# Altium footprint library Transformers.PcbLib: 81 footprints (part 6 of 6)
Each footprint in its own frame and in the unit in brackets; x right, y up, seen from the top. Pads: shape width x height; smd on the part's side, far side on the other; paste and mask are expansions set on the pad; w line width, h text height; cw(c..) or ccw(c..) is an arc to the next point about the centre after c.
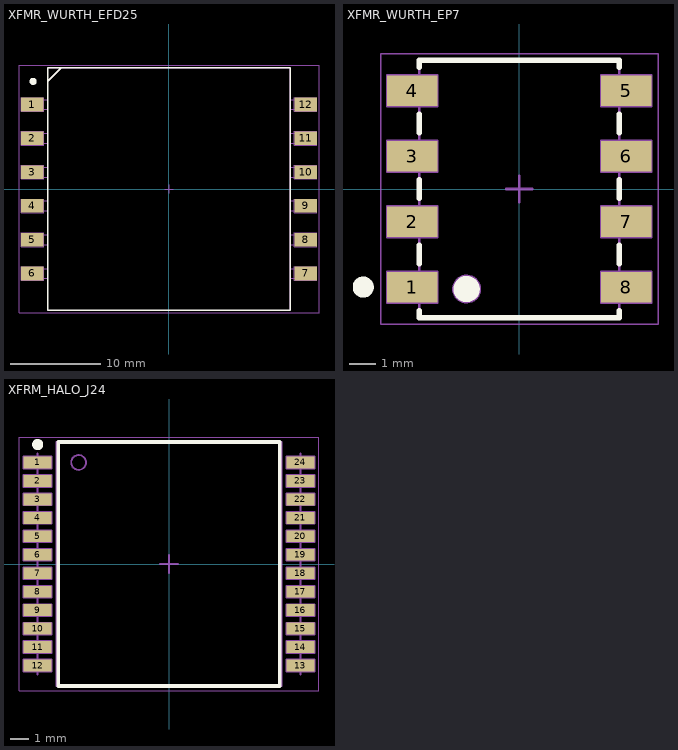
[diagram p5: the footprints below, top view; thin cyan lines are the x and y axes]

## XFMR_WURTH_EFD25 [mm] "WE-FB Flyback Transformer, Body 32.31 x 27.03mm, Size EFD25"
height 13.69
pads (12):
  rect 2.5x1.52 smd: 1(-15.19,9.4) 2(-15.19,5.64) 3(-15.19,1.88) 4(-15.19,-1.88) 5(-15.19,-5.64) 6(-15.19,-9.4) 7(15.19,-9.4) 8(15.19,-5.64) 9(15.19,-1.88) 10(15.19,1.88) 11(15.19,5.64) 12(15.19,9.4)
Top Overlay:
  circle w0.4: c-15.125,11.975 r0.2
  lines w0.2: -12,13.5 -13.5,12 ; -13.5,12 -13.5,12 ; -13.5,-13.5 13.5,-13.5 13.5,13.5 -13.5,13.5 -13.5,-13.5
Mechanical 8:
  lines w0.1: -15.69,-9.4 -15.19,-9.4 ; -15.69,-5.64 -15.19,-5.64 ; -15.69,-1.88 -15.19,-1.88 ; -15.69,1.88 -15.19,1.88 ; -15.69,5.64 -15.19,5.64 ; -15.69,9.4 -15.19,9.4 ; -15.19,-9.9 -15.19,-9.4 ; -15.19,-8.9 -15.19,-9.4 ; -15.19,-6.14 -15.19,-5.64 ; -15.19,-5.14 -15.19,-5.64 ; -15.19,-2.38 -15.19,-1.88 ; -15.19,-1.38 -15.19,-1.88 ; -15.19,1.38 -15.19,1.88 ; -15.19,2.38 -15.19,1.88 ; -15.19,5.14 -15.19,5.64 ; -15.19,6.14 -15.19,5.64 ; -15.19,8.9 -15.19,9.4 ; -15.19,9.9 -15.19,9.4 ; -14.69,-9.4 -15.19,-9.4 ; -14.69,-5.64 -15.19,-5.64 ; -14.69,-1.88 -15.19,-1.88 ; -14.69,1.88 -15.19,1.88 ; -14.69,5.64 -15.19,5.64 ; -14.69,9.4 -15.19,9.4 ; -0.5,0 0,0 ; 0,-0.5 0,0 ; 0,0.5 0,0 ; 0.5,0 0,0 ; 14.69,-9.4 15.19,-9.4 ; 14.69,-5.64 15.19,-5.64 ; 14.69,-1.88 15.19,-1.88 ; 14.69,1.88 15.19,1.88 ; 14.69,5.64 15.19,5.64 ; 14.69,9.4 15.19,9.4 ; 15.19,-9.9 15.19,-9.4 ; 15.19,-8.9 15.19,-9.4 ; 15.19,-6.14 15.19,-5.64 ; 15.19,-5.14 15.19,-5.64 ; 15.19,-2.38 15.19,-1.88 ; 15.19,-1.38 15.19,-1.88 ; 15.19,1.38 15.19,1.88 ; 15.19,2.38 15.19,1.88 ; 15.19,5.14 15.19,5.64 ; 15.19,6.14 15.19,5.64 ; 15.19,8.9 15.19,9.4 ; 15.19,9.9 15.19,9.4 ; 15.69,-9.4 15.19,-9.4 ; 15.69,-5.64 15.19,-5.64 ; 15.69,-1.88 15.19,-1.88 ; 15.69,1.88 15.19,1.88 ; 15.69,5.64 15.19,5.64 ; 15.69,9.4 15.19,9.4 ; -16.44,-10.16 -16.44,-8.64 -13.94,-8.64 -13.94,-10.16 -16.44,-10.16 ; -16.44,-6.4 -16.44,-4.88 -13.94,-4.88 -13.94,-6.4 -16.44,-6.4 ; -16.44,-2.64 -16.44,-1.12 -13.94,-1.12 -13.94,-2.64 -16.44,-2.64 ; -16.44,1.12 -16.44,2.64 -13.94,2.64 -13.94,1.12 -16.44,1.12 ; -16.44,4.88 -16.44,6.4 -13.94,6.4 -13.94,4.88 -16.44,4.88 ; -16.44,8.64 -16.44,10.16 -13.94,10.16 -13.94,8.64 -16.44,8.64 ; 13.94,-10.16 13.94,-8.64 16.44,-8.64 16.44,-10.16 13.94,-10.16 ; 13.94,-6.4 13.94,-4.88 16.44,-4.88 16.44,-6.4 13.94,-6.4 ; 13.94,-2.64 13.94,-1.12 16.44,-1.12 16.44,-2.64 13.94,-2.64 ; 13.94,1.12 13.94,2.64 16.44,2.64 16.44,1.12 13.94,1.12 ; 13.94,4.88 13.94,6.4 16.44,6.4 16.44,4.88 13.94,4.88 ; 13.94,8.64 13.94,10.16 16.44,10.16 16.44,8.64 13.94,8.64
Mechanical 14:
  lines w0.1: -13.5,-9.95 -15.75,-9.95 -15.75,-8.85 -13.5,-8.85 ; -13.5,-6.19 -15.75,-6.19 -15.75,-5.09 -13.5,-5.09 ; -13.5,-2.43 -15.75,-2.43 -15.75,-1.33 -13.5,-1.33 ; -13.5,1.33 -15.75,1.33 -15.75,2.43 -13.5,2.43 ; -13.5,5.09 -15.75,5.09 -15.75,6.19 -13.5,6.19 ; -13.5,8.85 -15.75,8.85 -15.75,9.95 -13.5,9.95 ; -13.5,12 -12,13.5 ; 13.5,-9.95 15.75,-9.95 15.75,-8.85 13.5,-8.85 ; 13.5,-6.19 15.75,-6.19 15.75,-5.09 13.5,-5.09 ; 13.5,-2.43 15.75,-2.43 15.75,-1.33 13.5,-1.33 ; 13.5,1.33 15.75,1.33 15.75,2.43 13.5,2.43 ; 13.5,5.09 15.75,5.09 15.75,6.19 13.5,6.19 ; 13.5,8.85 15.75,8.85 15.75,9.95 13.5,9.95 ; -13.5,-13.5 13.5,-13.5 13.5,13.5 -13.5,13.5 -13.5,-13.5
Mechanical 15:
  lines w0.05: -16.69,-13.75 -16.69,13.75 16.69,13.75 16.69,-13.75 -16.69,-13.75
3D body "XFMR_WURTH_EFD25.stp": height 13.69, standoff 0, extent -15.75,-13.5 15.75,13.5

## XFMR_WURTH_EP7 [mm] "WE-FB Flyback Transformer, Body 9.14 x 9.78mm, Size EP7"
height 10.54
pads (8):
  rect 1.91x1.17 smd: 1(-4.065,-3.735) 2(-4.065,-1.245) 3(-4.065,1.245) 4(-4.065,3.735) 5(4.065,3.735) 6(4.065,1.245) 7(4.065,-1.245) 8(4.065,-3.735)
Top Overlay:
  circle w0.5: c-2,-3.8 r0.25
  circle w0.4: c-5.925,-3.725 r0.2
  lines w0.2: -3.8,-4.62 -3.8,-4.89 3.8,-4.89 3.8,-4.62 ; -3.8,-2.85 -3.8,-2.13 ; -3.8,-0.36 -3.8,0.36 ; -3.8,2.13 -3.8,2.85 ; -3.8,4.62 -3.8,4.89 3.8,4.89 3.8,4.62 ; 3.8,-2.85 3.8,-2.13 ; 3.8,-0.36 3.8,0.36 ; 3.8,2.13 3.8,2.85
Mechanical 8:
  lines w0.1: -4.565,-3.735 -4.065,-3.735 ; -4.565,-1.245 -4.065,-1.245 ; -4.565,1.245 -4.065,1.245 ; -4.565,3.735 -4.065,3.735 ; -4.065,-4.235 -4.065,-3.735 ; -4.065,-3.235 -4.065,-3.735 ; -4.065,-1.745 -4.065,-1.245 ; -4.065,-0.745 -4.065,-1.245 ; -4.065,0.745 -4.065,1.245 ; -4.065,1.745 -4.065,1.245 ; -4.065,3.235 -4.065,3.735 ; -4.065,4.235 -4.065,3.735 ; -3.565,-3.735 -4.065,-3.735 ; -3.565,-1.245 -4.065,-1.245 ; -3.565,1.245 -4.065,1.245 ; -3.565,3.735 -4.065,3.735 ; -0.5,0 0,0 ; 0,-0.5 0,0 ; 0,0.5 0,0 ; 0.5,0 0,0 ; 3.565,-3.735 4.065,-3.735 ; 3.565,-1.245 4.065,-1.245 ; 3.565,1.245 4.065,1.245 ; 3.565,3.735 4.065,3.735 ; 4.065,-4.235 4.065,-3.735 ; 4.065,-3.235 4.065,-3.735 ; 4.065,-1.745 4.065,-1.245 ; 4.065,-0.745 4.065,-1.245 ; 4.065,0.745 4.065,1.245 ; 4.065,1.745 4.065,1.245 ; 4.065,3.235 4.065,3.735 ; 4.065,4.235 4.065,3.735 ; 4.565,-3.735 4.065,-3.735 ; 4.565,-1.245 4.065,-1.245 ; 4.565,1.245 4.065,1.245 ; 4.565,3.735 4.065,3.735 ; -5.02,-4.32 -3.11,-4.32 -3.11,-3.15 -5.02,-3.15 -5.02,-4.32 ; -5.02,-1.83 -3.11,-1.83 -3.11,-0.66 -5.02,-0.66 -5.02,-1.83 ; -5.02,0.66 -3.11,0.66 -3.11,1.83 -5.02,1.83 -5.02,0.66 ; -5.02,3.15 -3.11,3.15 -3.11,4.32 -5.02,4.32 -5.02,3.15 ; -4.575,-4.115 -3.555,-4.115 -3.555,-3.355 -4.575,-3.355 -4.575,-4.115 ; -4.575,-1.625 -3.555,-1.625 -3.555,-0.865 -4.575,-0.865 -4.575,-1.625 ; -4.575,0.865 -3.555,0.865 -3.555,1.625 -4.575,1.625 -4.575,0.865 ; -4.575,3.355 -3.555,3.355 -3.555,4.115 -4.575,4.115 -4.575,3.355 ; 3.11,-4.32 5.02,-4.32 5.02,-3.15 3.11,-3.15 3.11,-4.32 ; 3.11,-1.83 5.02,-1.83 5.02,-0.66 3.11,-0.66 3.11,-1.83 ; 3.11,0.66 5.02,0.66 5.02,1.83 3.11,1.83 3.11,0.66 ; 3.11,3.15 5.02,3.15 5.02,4.32 3.11,4.32 3.11,3.15 ; 3.555,-4.115 4.575,-4.115 4.575,-3.355 3.555,-3.355 3.555,-4.115 ; 3.555,-1.625 4.575,-1.625 4.575,-0.865 3.555,-0.865 3.555,-1.625 ; 3.555,0.865 4.575,0.865 4.575,1.625 3.555,1.625 3.555,0.865 ; 3.555,3.355 4.575,3.355 4.575,4.115 3.555,4.115 3.555,3.355
Mechanical 14:
  circle w0.1: c-2,-3.8 r0.5
  lines w0.1: -3.8,-4.085 -4.57,-4.085 -4.57,-3.385 -3.8,-3.385 ; -3.8,-1.595 -4.57,-1.595 -4.57,-0.895 -3.8,-0.895 ; -3.8,0.895 -4.57,0.895 -4.57,1.595 -3.8,1.595 ; -3.8,3.385 -4.57,3.385 -4.57,4.085 -3.8,4.085 ; 3.8,-4.085 4.57,-4.085 4.57,-3.385 3.8,-3.385 ; 3.8,-1.595 4.57,-1.595 4.57,-0.895 3.8,-0.895 ; 3.8,0.895 4.57,0.895 4.57,1.595 3.8,1.595 ; 3.8,3.385 4.57,3.385 4.57,4.085 3.8,4.085 ; -3.8,-4.89 -3.8,4.89 3.8,4.89 3.8,-4.89 -3.8,-4.89
Mechanical 15:
  lines w0.05: -5.27,-5.14 -5.27,5.14 5.27,5.14 5.27,-5.14 -5.27,-5.14
3D body "XFMR_WURTH_EP7.stp": height 10.54, standoff 0, extent -4.57,-4.89 4.57,4.89

## XFRM_HALO_J24 [mm] "Single Port GigE Transformer, HALO Case J24 Body 12.19 x 15.24mm"
height 3.76
pads (24):
  rect 1.52x0.64 smd: 1(-7.115,5.5) 2(-7.115,4.5) 3(-7.115,3.5) 4(-7.115,2.5) 5(-7.115,1.5) 6(-7.115,0.5) 7(-7.115,-0.5) 8(-7.115,-1.5) 9(-7.115,-2.5) 10(-7.115,-3.5) 11(-7.115,-4.5) 12(-7.115,-5.5) 13(7.115,-5.5) 14(7.115,-4.5) 15(7.115,-3.5) 16(7.115,-2.5) 17(7.115,-1.5) 18(7.115,-0.5) 19(7.115,0.5) 20(7.115,1.5) 21(7.115,2.5) 22(7.115,3.5) 23(7.115,4.5) 24(7.115,5.5)
Top Overlay:
  circle w0.4: c-7.115,6.47 r0.1
  lines w0.2: -6.005,-6.605 6.005,-6.605 6.005,6.605 -6.005,6.605 -6.005,-6.605
Mechanical 8:
  drawing of 196 lines, arcs and shapes, not listed
Mechanical 14:
  circle w0.1: c-4.895,5.5 r0.4
  lines w0.1: -6.095,-6.605 6.095,-6.605 6.095,6.605 -6.095,6.605 -6.095,-6.605
Mechanical 15:
  lines w0.05: -8.125,-6.855 8.125,-6.855 8.125,6.855 -8.125,6.855 -8.125,-6.855
3D body "XFRM_HALO_J24.stp": height 3.76, standoff 0, extent -7.62,-6.605 7.62,6.605